# Altium footprint library Wurth_Elektronik_Electromechanic_Wire_to_Board_Connectors_rev16a.PCBLIB: 662 footprints (part 1 of 42)
Each footprint in its own frame and in the unit in brackets; x right, y up, seen from the top. Pads: shape width x height; smd on the part's side, far side on the other; paste and mask are expansions set on the pad; w line width, h text height; cw(c..) or ccw(c..) is an arc to the next point about the centre after c.
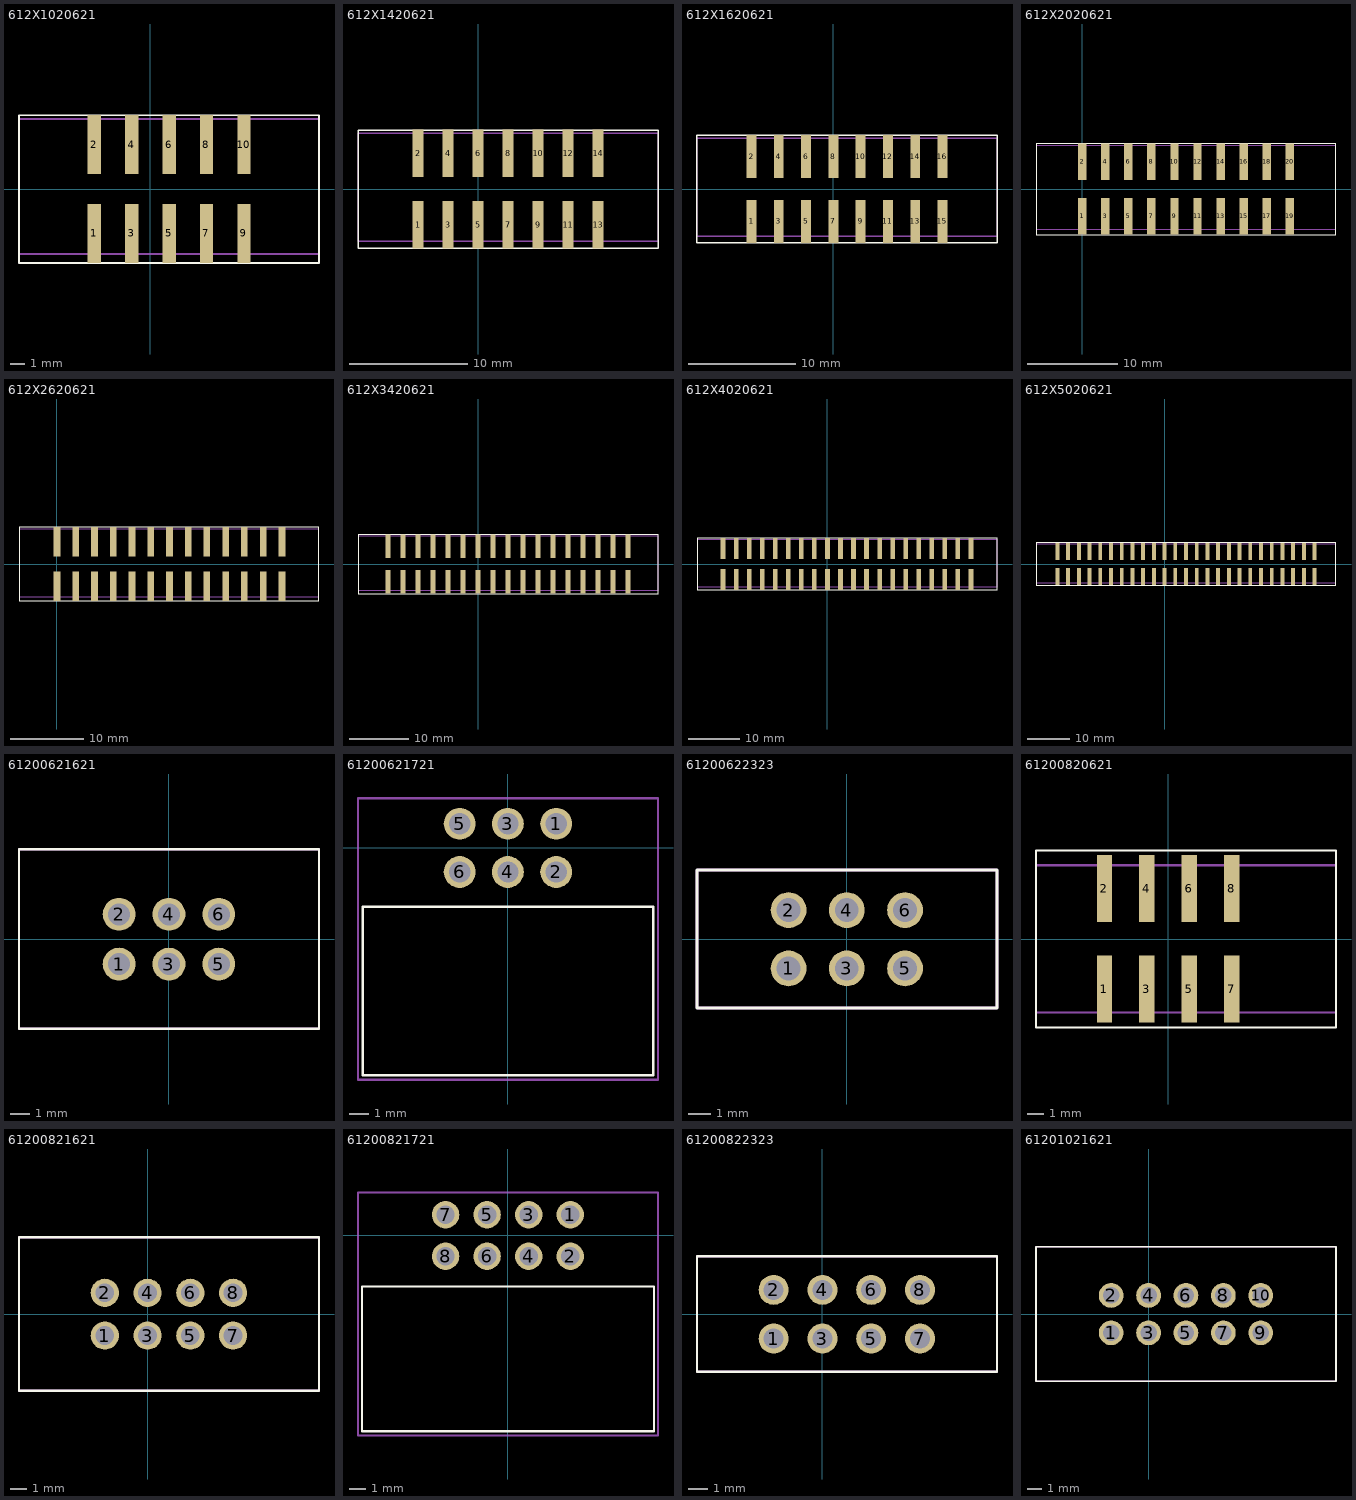
[diagram p0: the footprints below, top view; thin cyan lines are the x and y axes]

## 612X1020621 [mil]
pads (10):
  rect 36x158 smd: 1(-150,-118.11) 2(-150,119) 3(-50,-118.11) 4(-50,119) 5(50,-118.11) 6(50,119) 7(150,-118.11) 8(150,119) 9(250,-118.11) 10(250,119)
Top Overlay:
  lines w5: -350,-196.85 450,-196.85 450,197 -350,197 -350,-196.85
Mechanical 2:
  text ">NAME" at -75,250 h77.5
Mechanical 4:
  text ">VALUE" at -100,-300 h77.5
Mechanical 16:
  lines w5: -350,-173.23 450,-173.23 450,187 -350,187 -350,-173.23
  text "1" at -175,-125 h77.5
  text "10" at 225,100 h77.5
  text "1" at -175,-125 h77.5

## 612X1420621 [mil]
pads (14):
  rect 36x158 smd: 1(-200,-118.11) 2(-200,119) 3(-100,-118.11) 4(-100,119) 5(0,-118.11) 6(0,119) 7(100,-118.11) 8(100,119) 9(200,-118.11) 10(200,119) 11(300,-118.11) 12(300,119) 13(400,-118.11) 14(400,119)
Top Overlay:
  lines w5: -400,-196.85 600,-196.85 600,197 -400,197 -400,-196.85
Mechanical 2:
  text ">NAME" at 25,250 h77.5
Mechanical 4:
  text ">VALUE" at 0,-300 h77.5
Mechanical 16:
  lines w5: -400,-173.23 600,-173.23 600,187 -400,187 -400,-173.23
  text "1" at -225,-125 h77.5
  text "14" at 375,100 h77.5
  text "1" at -225,-125 h77.5

## 612X1620621 [mil]
pads (16):
  rect 36x158 smd: 1(-300,-118.11) 2(-300,119) 3(-200,-118.11) 4(-200,119) 5(-100,-118.11) 6(-100,119) 7(0,-118.11) 8(0,119) 9(100,-118.11) 10(100,119) 11(200,-118.11) 12(200,119) 13(300,-118.11) 14(300,119) 15(400,-118.11) 16(400,119)
Top Overlay:
  lines w5: -500,-196.85 600,-196.85 600,197 -500,197 -500,-196.85
Mechanical 2:
  text ">NAME" at -25,250 h77.5
Mechanical 4:
  text ">VALUE" at -25,-300 h77.5
Mechanical 16:
  lines w5: -500,-173.23 600,-173.23 600,187 -500,187 -500,-173.23
  text "1" at -325,-125 h77.5
  text "16" at 350,75 h77.5
  text "1" at -325,-125 h77.5

## 612X2020621 [mil]
pads (20):
  rect 36x158 smd: 1(0,-118.11) 2(0,119) 3(100,-118.11) 4(100,119) 5(200,-118.11) 6(200,119) 7(300,-118.11) 8(300,119) 9(400,-118.11) 10(400,119) 11(500,-118.11) 12(500,119) 13(600,-118.11) 14(600,119) 15(700,-118.11) 16(700,119) 17(800,-118.11) 18(800,119) 19(900,-118.11) 20(900,119)
Top Overlay:
  lines w5: -200,-196.85 1100,-196.85 1100,197 -200,197 -200,-196.85
Mechanical 2:
  text ">NAME" at 375,225 h77.5
Mechanical 4:
  text ">VALUE" at 350,-275 h77.5
Mechanical 16:
  lines w5: -200,-173.23 1100,-173.23 1100,187 -200,187 -200,-173.23
  text "1" at -25,-125 h77.5
  text "20" at 850,75 h77.5
  text "1" at -25,-125 h77.5

## 612X2620621 [mil]
pads (26):
  rect 36x158 smd: 1(2,-118.11) 2(2,119) 3(102,-118.11) 4(102,119) 5(202,-118.11) 6(202,119) 7(302,-118.11) 8(302,119) 9(402,-118.11) 10(402,119) 11(502,-118.11) 12(502,119) 13(602,-118.11) 14(602,119) 15(702,-118.11) 16(702,119) 17(802,-118.11) 18(802,119) 19(902,-118.11) 20(902,119) 21(1002,-118.11) 22(1002,119) 23(1102,-118.11) 24(1102,119) 25(1202,-118.11) 26(1202,119)
Top Overlay:
  lines w5: -200,-196.85 1400,-196.85 1400,197 -200,197 -200,-196.85
Mechanical 2:
  text ">NAME" at 452,250 h77.5
Mechanical 4:
  text ">VALUE" at 477,-300 h77.5
Mechanical 16:
  lines w5: -200,-173.23 1400,-173.23 1400,187 -200,187 -200,-173.23
  text "1" at -23.82,-125 h77.5
  text "26" at 1177,75 h77.5
  text "1" at -25,-125 h77.5

## 612X3420621 [mil]
pads (34):
  rect 36x158 smd: 1(-600,-118.11) 2(-600,119) 3(-500,-118.11) 4(-500,119) 5(-400,-118.11) 6(-400,119) 7(-300,-118.11) 8(-300,119) 9(-200,-118.11) 10(-200,119) 11(-100,-118.11) 12(-100,119) 13(0,-118.11) 14(0,119) 15(100,-118.11) 16(100,119) 17(200,-118.11) 18(200,119) 19(300,-118.11) 20(300,119) 21(400,-118.11) 22(400,119) 23(500,-118.11) 24(500,119) 25(600,-118.11) 26(600,119) 27(700,-118.11) 28(700,119) 29(800,-118.11) 30(800,119) 31(900,-118.11) 32(900,119) 33(1000,-118.11) 34(1000,119)
Top Overlay:
  lines w5: -800,-196.85 1200,-196.85 1200,197 -800,197 -800,-196.85
Mechanical 2:
  text ">NAME" at 150,250 h77.5
Mechanical 4:
  text ">VALUE" at 125,-300 h77.5
Mechanical 16:
  lines w5: -800,-173.23 1200,-173.23 1200,187 -800,187 -800,-173.23
  text "1" at -625,-125 h77.5
  text "34" at 975,75 h77.5
  text "1" at -625,-125 h77.5

## 612X4020621 [mil]
pads (40):
  rect 36x158 smd: 1(-800,-118.11) 2(-800,119) 3(-700,-118.11) 4(-700,119) 5(-600,-118.11) 6(-600,119) 7(-500,-118.11) 8(-500,119) 9(-400,-118.11) 10(-400,119) 11(-300,-118.11) 12(-300,119) 13(-200,-118.11) 14(-200,119) 15(-100,-118.11) 16(-100,119) 17(0,-118.11) 18(0,119) 19(100,-118.11) 20(100,119) 21(200,-118.11) 22(200,119) 23(300,-118.11) 24(300,119) 25(400,-118.11) 26(400,119) 27(500,-118.11) 28(500,119) 29(600,-118.11) 30(600,119) 31(700,-118.11) 32(700,119) 33(800,-118.11) 34(800,119) 35(900,-118.11) 36(900,119) 37(1000,-118.11) 38(1000,119) 39(1100,-118.11) 40(1100,119)
Top Overlay:
  lines w5: -1000,-196.85 1300,-196.85 1300,197 -1000,197 -1000,-196.85
Mechanical 2:
  text ">NAME" at 75,225 h77.5
Mechanical 4:
  text ">VALUE" at 75,-300 h77.5
Mechanical 16:
  lines w5: -1000,-173.23 1300,-173.23 1300,187 -1000,187 -1000,-173.23
  text "1" at -825,-125 h77.5
  text "40" at 1075,100 h77.5
  text "1" at -825,-125 h77.5

## 612X5020621 [mil]
pads (50):
  rect 36x158 smd: 1(-1000,-118.11) 2(-1000,119) 3(-900,-118.11) 4(-900,119) 5(-800,-118.11) 6(-800,119) 7(-700,-118.11) 8(-700,119) 9(-600,-118.11) 10(-600,119) 11(-500,-118.11) 12(-500,119) 13(-400,-118.11) 14(-400,119) 15(-300,-118.11) 16(-300,119) 17(-200,-118.11) 18(-200,119) 19(-100,-118.11) 20(-100,119) 21(0,-118.11) 22(0,119) 23(100,-118.11) 24(100,119) 25(200,-118.11) 26(200,119) 27(300,-118.11) 28(300,119) 29(400,-118.11) 30(400,119) 31(500,-118.11) 32(500,119) 33(600,-118.11) 34(600,119) 35(700,-118.11) 36(700,119) 37(800,-118.11) 38(800,119) 39(900,-118.11) 40(900,119) 41(1000,-118.11) 42(1000,119) 43(1100,-118.11) 44(1100,119) 45(1200,-118.11) 46(1200,119) 47(1300,-118.11) 48(1300,119) 49(1400,-118.11) 50(1400,119)
Top Overlay:
  lines w5: -1200,-196.85 1600,-196.85 1600,197 -1200,197 -1200,-196.85
Mechanical 2:
  text ">NAME" at 100,250 h77.5
Mechanical 4:
  text ">VALUE" at 125,-300 h77.5
Mechanical 16:
  lines w5: -1200,-173.23 1600,-173.23 1600,187 -1200,187 -1200,-173.23
  text "1" at -1025,-125 h77.5
  text "50" at 1350,75 h77.5
  text "1" at -1025,-125 h77.5
  text "20" at -150,75 h77.5

## 61200621621 [mil]
pads (6):
  round 66 hole 44: 1(-100,-50) 2(-100,50) 3(0,-50) 4(0,50) 5(100,-50) 6(100,50)
Top Overlay:
  lines w5: -300.79,-179.13 301,-179.13 301,180 -300.79,180 -300.79,-179.13
Mechanical 2:
  text ">NAME" at -125,200 h77.5
Mechanical 4:
  text ">VALUE" at -150,-250 h77.5
Mechanical 16:
  lines w5: -300.79,-179.13 301,-179.13 301,180 -300.79,180 -300.79,-179.13
  text "1" at -125,-75 h77.5
  text "6" at 75,25 h77.5

## 61200621721 [mil]
pads (6):
  round 66 hole 44: 1(100,50) 2(100,-50) 3(0,50) 4(0,-50) 5(-100,50) 6(-100,-50)
Top Overlay:
  lines w5: -300.79,-470.87 301,-470.87 301,-122.44 -300.79,-122.44 -300.79,-470.87
Mechanical 2:
  text ">NAME" at 357,-250.7 h77.5
Mechanical 4:
  text ">VALUE" at 357,-348.7 h77.5
Mechanical 16:
  text "1" at 75,25 h77.5
  text "6" at -125,-75 h77.5
  text "2" at 75,-75 h77.5
Mechanical 27:
  lines w5: -310.63,-480.71 311,-480.71 311,103 -310.63,103 -310.63,-480.71

## 61200622323 [mil]
pads (6):
  round 61.5 hole 41: 1(-100,-50) 2(-100,50) 3(0,-50) 4(0,50) 5(100,-50) 6(100,50)
Top Overlay:
  lines w5: -257.28,-118.11 258,-118.11 258,119 -257.28,119 -257.28,-118.11
Mechanical 2:
  text ">NAME" at -125,150 h77.5
Mechanical 4:
  text ">VALUE" at -150,-200 h77.5
Mechanical 16:
  lines w5: -257.28,-118.11 258,-118.11 258,119 -257.28,119 -257.28,-118.11
  text "1" at -125,-75 h77.5
  text "6" at 75,25 h77.5

## 61200820621 [mil]
pads (8):
  rect 36x158 smd: 1(-150,-118.11) 2(-150,119) 3(-50,-118.11) 4(-50,119) 5(50,-118.11) 6(50,119) 7(150,-118.11) 8(150,119)
Top Overlay:
  lines w5: -311.42,-208.66 396,-208.66 396,209 -311.42,209 -311.42,-208.66
Mechanical 2:
  text ">NAME" at -75,250 h77.5
Mechanical 4:
  text ">VALUE" at -100,-300 h77.5
Mechanical 16:
  lines w5: -311.42,-173.23 -311.42,174 396,174 396,-173.23 -311.42,-173.23
  text "1" at -175,-125 h77.5
  text "8" at 125,100 h77.5

## 61200821621 [mil]
pads (8):
  round 66 hole 44: 1(-100,-50) 2(-100,50) 3(0,-50) 4(0,50) 5(100,-50) 6(100,50) 7(200,-50) 8(200,50)
Top Overlay:
  lines w5: -300.79,-179.13 401,-179.13 401,180 -300.79,180 -300.79,-179.13
Mechanical 2:
  text ">NAME" at -50,200 h77.5
Mechanical 4:
  text ">VALUE" at -50,-250 h77.5
Mechanical 16:
  lines w5: -300.79,-179.13 401,-179.13 401,180 -300.79,180 -300.79,-179.13
  text "1" at -125,-75 h77.5
  text "8" at 182,22 h77.5

## 61200821721 [mil]
pads (8):
  round 66 hole 44: 1(150,50) 2(150,-50) 3(50,50) 4(50,-50) 5(-50,50) 6(-50,-50) 7(-150,50) 8(-150,-50)
Top Overlay:
  lines w5: -350.79,-470.87 351,-470.87 351,-122.44 -350.79,-122.44 -350.79,-470.87
Mechanical 2:
  text ">NAME" at 407,-250.7 h77.5
Mechanical 4:
  text ">VALUE" at 407,-348.7 h77.5
Mechanical 16:
  text "1" at 125,25 h77.5
  text "8" at -175,-75 h77.5
  text "2" at 125,-75 h77.5
Mechanical 27:
  lines w5: -360.63,-480.71 361,-480.71 361,103 -360.63,103 -360.63,-480.71

## 61200822323 [mil]
pads (8):
  round 61.5 hole 41: 1(-100,-50) 2(-100,50) 3(0,-50) 4(0,50) 5(100,-50) 6(100,50) 7(200,-50) 8(200,50)
Top Overlay:
  lines w5: -257.28,-118.11 358,-118.11 358,119 -257.28,119 -257.28,-118.11
Mechanical 2:
  text ">NAME" at -75,150 h77.5
Mechanical 4:
  text ">VALUE" at -100,-200 h77.5
Mechanical 16:
  lines w5: -257.28,-118.11 358,-118.11 358,119 -257.28,119 -257.28,-118.11
  text "1" at -125,-75 h77.5
  text "8" at 175,25 h77.5

## 61201021621 [mil]
pads (10):
  round 66 hole 44: 1(-100,-50) 2(-100,50) 3(0,-50) 4(0,50) 5(100,-50) 6(100,50) 7(200,-50) 8(200,50) 9(300,-50) 10(300,50)
Top Overlay:
  lines w5: -300.79,-179.13 501,-179.13 501,180 -300.79,180 -300.79,-179.13
Mechanical 2:
  text ">NAME" at 0,200 h77.5
Mechanical 4:
  text ">VALUE" at 0,-250 h77.5
Mechanical 16:
  lines w5: -300.79,-179.13 501,-179.13 501,180 -300.79,180 -300.79,-179.13
  text "1" at -125,-75 h77.5
  text "10" at 257,22 h77.5